# Altium footprint library Altium_Lib.PcbLib: 334 footprints (part 4 of 21)
Each footprint in its own frame and in the unit in brackets; x right, y up, seen from the top. Pads: shape width x height; smd on the part's side, far side on the other; paste and mask are expansions set on the pad; w line width, h text height; cw(c..) or ccw(c..) is an arc to the next point about the centre after c.
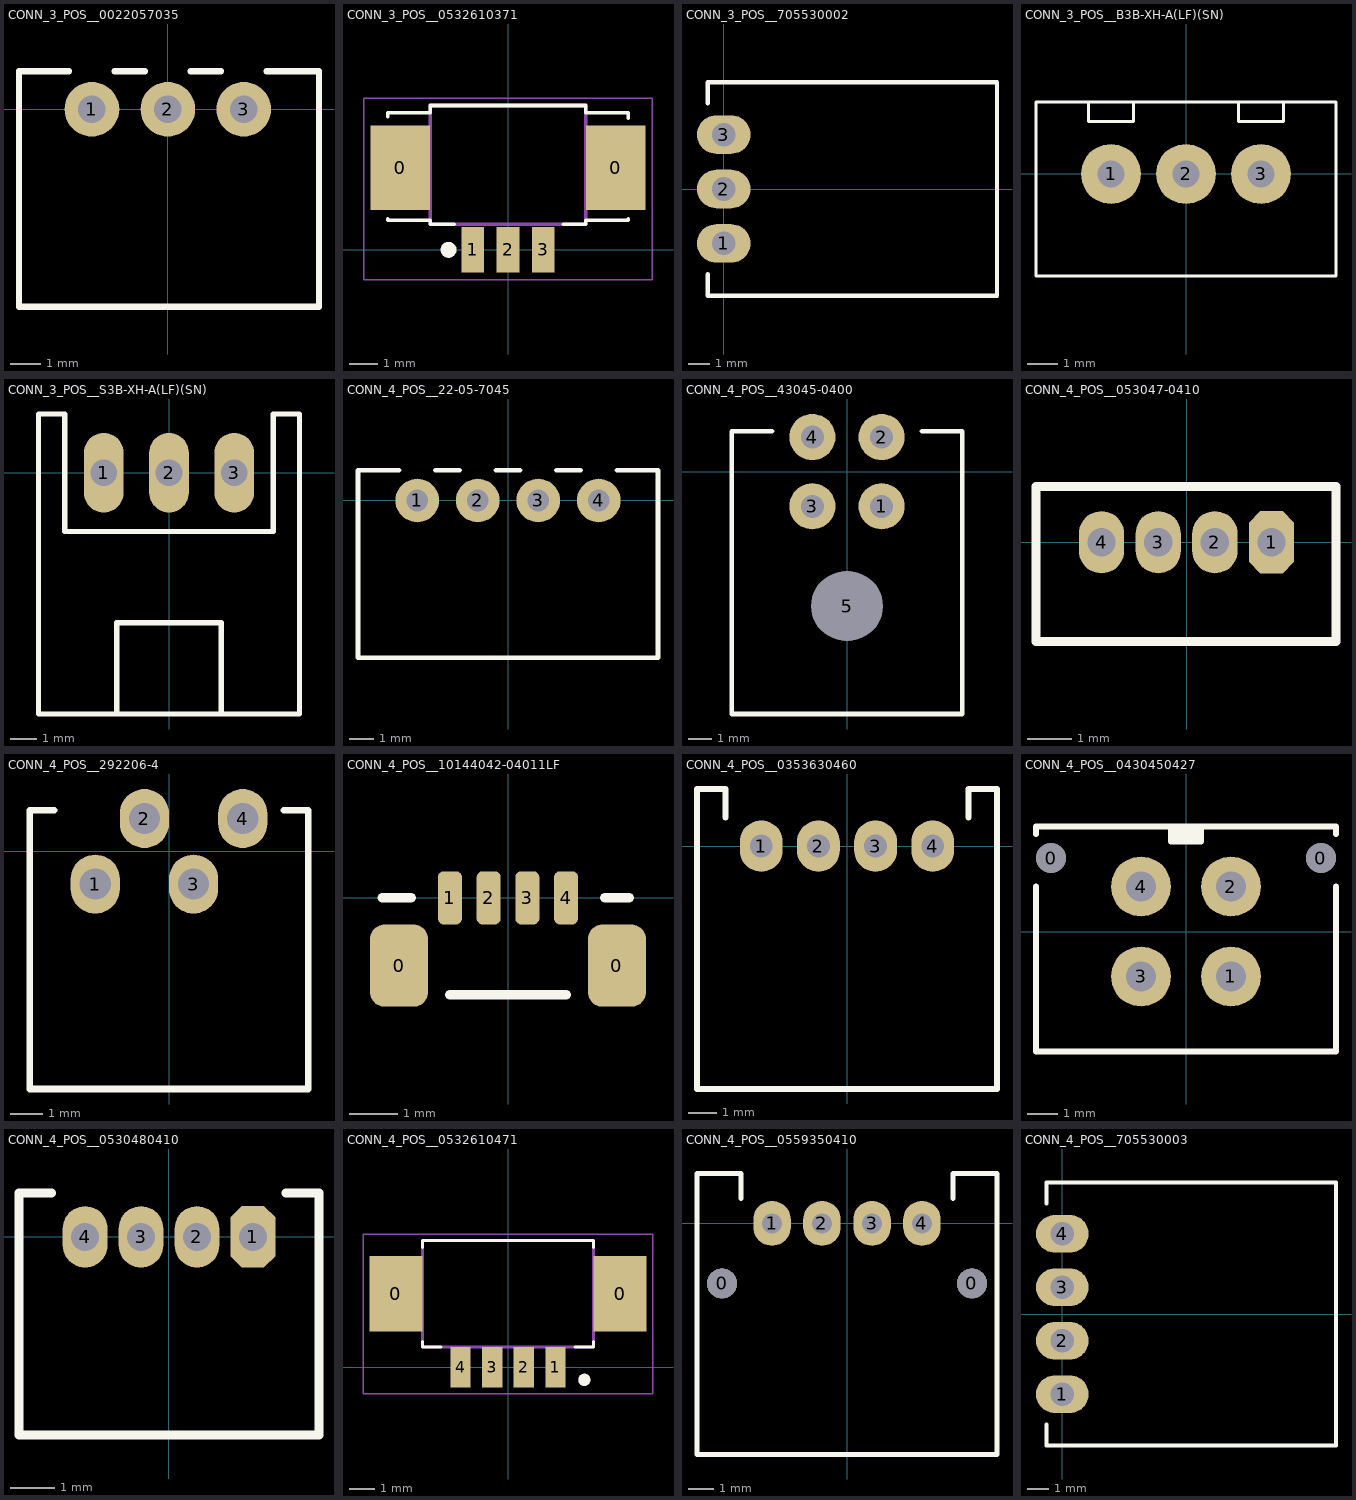
[diagram p3: the footprints below, top view; thin cyan lines are the x and y axes]

## CONN_3_POS__0022057035 [mm]
pads (3):
  round 1.8 hole 0.9: 1(-2.5,0) 2(0,0) 3(2.5,0)
Top Overlay:
  lines w0.2: -3.25,1.25 -4.9,1.25 -4.9,-6.5 4.975,-6.5 4.975,1.25 3.25,1.25 ; -1.75,1.25 -0.75,1.25 ; 0.75,1.25 1.75,1.25
3D body "022057035.stp": height 4.95, standoff -3.45, extent -4.9,-6.55 5,1.35

## CONN_3_POS__0532610371 [mm]
pads (5):
  rect 2.1x3 smd: 0(-3.8,2.9) 0(3.8,2.9)
  rect 0.8x1.6 smd: 1(-1.25,0) 2(0,0) 3(1.25,0)
Top Overlay:
  circle w0.28: c-2.1,0 r0.14
  circle w0.28: c-2.1,0 r0.14
  lines w0.127: -4.25,1.1 -4.25,1.05 -2.75,1.05 -2.75,0.9 -1.9,0.9 ; -4.25,4.7 -4.25,4.85 -2.75,4.85 -2.75,5.1 2.75,5.1 2.75,4.85 4.25,4.85 4.25,4.65 ; 1.95,0.9 2.75,0.9 2.75,1.05 4.25,1.05 4.25,1.1
Mechanical 4:
  lines w0.127: -2.75,0.9 -2.75,5.1 ; -2.75,0.9 2.75,0.9 ; -2.75,0.9 -2.75,5.1 ; -2.75,0.9 2.75,0.9 ; -2.75,5.1 2.75,5.1 ; -2.75,5.1 2.75,5.1 ; 2.75,0.9 2.75,5.1 ; 2.75,0.9 2.75,5.1
Mechanical 16:
  lines w0.05: -5.1,-1.05 -5.1,5.35 5.1,5.35 5.1,-1.05 -5.1,-1.05
3D body "532610371.stp": height 3.4, standoff 0, extent -4.45,-0.475 4.45,4.725

## CONN_3_POS__705530002 [mm]
pads (3):
  oval 2.5x1.8 hole 1.1 mask+0.076: 1(0,-2.54) 2(0,0) 3(0,2.54)
Top Overlay:
  lines w0.2: -0.75,-3.98 -0.75,-4.98 12.75,-4.98 12.75,4.98 -0.75,4.98 -0.75,4
3D body "705530002.stp": height 7.06, standoff -3.22, extent -0.674,-5.08 12.915,5.08

## CONN_3_POS__B3B-XH-A(LF)(SN) [mm]
pads (3):
  round 2 hole 0.9 mask+0.05: 1(-2.5,0) 2(0,0) 3(2.5,0)
Top Overlay:
  lines w0.1: -3.25,2.4 -3.25,1.75 -1.75,1.75 -1.75,2.4 ; 1.75,2.4 1.75,1.75 3.25,1.75 3.25,2.4 ; -5,-3.4 -5,2.4 5,2.4 5,-3.4 -5,-3.4
3D body "SW3dPS-jst-b3b-xh-a.STEP": height 7.1, standoff -3.3, extent -4.95,-3.4 4.95,2.35

## CONN_3_POS__S3B-XH-A(LF)(SN) [mil]
pads (3):
  oval 60x120 hole 40: 1(-98.43,0) 2(0,0) 3(98.43,0)
Top Overlay:
  lines w7.87: -78.74,-364.17 -78.74,-226.38 78.74,-226.38 78.74,-364.17 ; -196.85,-364.17 -196.85,88.58 -157.48,88.58 -157.48,-88.58 157.48,-88.58 157.48,88.58 196.85,88.58 196.85,-364.17 -196.85,-364.17
3D body "S3B-XH-A-LF--SN---3DModel-STEP-56544.STEP": height 242.13, standoff -133.86, extent -194.88,-360.23 194.89,92.52

## CONN_4_POS__22-05-7045 [mm] "2.50mm Wafer connector (molex)"
height 4.9
pads (4):
  round 1.8 hole 0.9: 1(-3.75,0) 2(-1.25,0) 3(1.25,0) 4(3.75,0)
Top Overlay:
  lines w0.2: -4.5,1.25 -6.2,1.25 -6.2,-6.5 6.2,-6.5 6.2,1.25 4.5,1.25 ; -3,1.25 -2,1.25 ; -0.5,1.25 0.5,1.25 ; 2,1.25 3,1.25
3D body "022057045.stp": height 4.95, standoff -3.45, extent -6.2,-6.55 6.2,1.35

## CONN_4_POS__43045-0400 [mm]
height 7.37
pads (5):
  round 2 hole 1: 1(1.5,-1.5) 2(1.5,1.5) 3(-1.5,-1.5) 4(-1.5,1.5)
  round 3 hole 3 slot 3.1 at 0 deg: 5(0,-5.82)
Top Overlay:
  lines w0.2: -3.25,1.75 -5,1.75 -5,-10.5 5,-10.5 5,1.75 3.25,1.75
3D body "430450400.stp": height 8.83, standoff -3.12, extent -5.075,-10.45 5.075,1.79

## CONN_4_POS__053047-0410 [mil]
pads (4):
  oct 40x55 hole 25: 1(75,0)
  oval 40x55 hole 25: 2(25,0) 3(-25,0) 4(-75,0)
Top Overlay:
  lines w7.87: -132.87,-87.6 131.89,-87.6 131.89,49.21 -132.87,49.21 -132.87,-87.6
3D body "User Library-53047-0410.STEP": height 169.29, standoff -86.61, extent -132.87,-87.8 132.87,50

## CONN_4_POS__292206-4 [mm]
pads (4):
  oval 1.5x1.8 hole 0.95 mask+0.05: 1(-2.25,-1) 2(-0.75,1) 3(0.75,-1) 4(2.25,1)
Top Overlay:
  lines w0.2: -3.5,1.25 -4.25,1.25 -4.25,-7.25 4.25,-7.25 4.25,1.25 3.5,1.25
3D body "c-292206-4-a-3d.stp": height 4.95, standoff -2.95, extent -4.25,-7.225 4.25,1.225

## CONN_4_POS__10144042-04011LF [mm]
pads (6):
  rrect50% 1.2x1.7 smd: 0(-2.25,-1.4) 0(2.25,-1.4)
  rrect50% 0.5x1.1 smd mask+0.05: 1(-1.2,0) 2(-0.4,0) 3(0.4,0) 4(1.2,0)
Top Overlay:
  lines w0.2: -2.6,0 -2,0 ; -1.2,-2 1.2,-2 ; 2,0 2.5,0
3D body "10144042-04011LF.STEP": height 2.7, standoff 0, extent -2.75,-2.05 2.65,0.05

## CONN_4_POS__0353630460 [mm]
pads (4):
  oval 1.5x1.8 hole 0.8: 1(-3,0) 2(-1,0) 3(1,0) 4(3,0)
Top Overlay:
  lines w0.2: -4.25,1 -4.25,2 -5.25,2 -5.25,-8.5 5.25,-8.5 5.25,2 4.25,2 4.25,1
3D body "353630460.stp": height 5.55, standoff -3.15, extent -5.15,-8.55 5.15,1.95

## CONN_4_POS__0430450427 [mm]
pads (6):
  round 1 hole 1 unplated mask+0.05: 0(-4.5,2.45) 0(4.5,2.45)
  round 2 hole 1: 1(1.5,-1.5) 2(1.5,1.5) 3(-1.5,-1.5) 4(-1.5,1.5)
Top Overlay:
  rectangle: -0.5,3 0.5,3.5
  lines w0.2: -5,1.5 -5,-4 5,-4 5,1.5 ; -5,3.25 -5,3.5 5,3.5 5,3.25 ; -0.5,3.5 -0.5,3 0.5,3 0.5,3.5
3D body "430450427.stp": height 9.95, standoff -3.14, extent -5.075,-3.97 5.075,4.8

## CONN_4_POS__0530480410 [mil]
pads (4):
  oct 40x55 hole 25: 1(75,0)
  oval 40x55 hole 25: 2(25,0) 3(-25,0) 4(-75,0)
Top Overlay:
  lines w7.87: -104.72,39.37 -134.06,39.37 -134.06,-177.17 134.06,-177.17 134.06,39.37 104.53,39.37
3D body "530480410.stp": height 139.76, standoff -88.58, extent -132.87,-173.23 132.87,43.31

## CONN_4_POS__0532610471 [mm]
pads (6):
  rect 2.1x3 smd: 0(-4.425,2.9) 0(4.425,2.9)
  rect 0.8x1.6 smd: 1(1.875,0) 2(0.625,0) 3(-0.625,0) 4(-1.875,0)
Top Overlay:
  circle w0.24: c3.015,-0.5 r0.12
  lines w0.127: -3.375,1 -3.375,0.8 -2.65,0.8 ; -3.375,4.725 -3.375,5 3.375,5 3.375,4.725 ; 2.65,0.8 3.375,0.8 3.375,1
Mechanical 4:
  circle w0.24: c3.015,-0.5 r0.12
  circle w0.24: c3.015,-0.5 r0.12
  lines w0.127: -3.375,0.8 -3.375,5 ; -3.375,0.8 3.375,0.8 ; -3.375,0.8 -3.375,5 ; -3.375,0.8 3.375,0.8 ; -3.375,5 3.375,5 ; -3.375,5 3.375,5 ; 3.375,0.8 3.375,5 ; 3.375,0.8 3.375,5
Mechanical 16:
  lines w0.05: -5.725,-1.05 -5.725,5.25 5.725,5.25 5.725,-1.05 -5.725,-1.05
3D body "532610471.stp": height 3.4, standoff 0, extent -5.075,-0.5 5.075,4.7

## CONN_4_POS__0559350410 [mm]
pads (6):
  round 1.2 hole 1.2 unplated mask+0.05: 0(-5,-2.4) 0(5,-2.4)
  oval 1.5x1.8 hole 0.8: 1(-3,0) 2(-1,0) 3(1,0) 4(3,0)
Top Overlay:
  lines w0.2: -4.25,1 -4.25,2 -6,2 -6,-9.25 6,-9.25 6,2 4.25,2 4.25,1
3D body "559350410.stp": height 6.9, standoff -3, extent -6,-9.75 6,2

## CONN_4_POS__705530003 [mm]
pads (4):
  oval 2.5x1.8 hole 1.1 mask+0.076: 1(0,-3.81) 2(0,-1.27) 3(0,1.27) 4(0,3.81)
Top Overlay:
  lines w0.2: -0.75,-5.25 -0.75,-6.25 13,-6.25 13,5.75 13,6.25 -0.75,6.25 -0.75,5.25
3D body "705530003.stp": height 6.98, standoff -3.3, extent -0.698,-6.35 12.891,6.35